# Altium footprint library DIOT_temperature_logger.PcbLib: 100 footprints (part 3 of 7)
Each footprint in its own frame and in the unit in brackets; x right, y up, seen from the top. Pads: shape width x height; smd on the part's side, far side on the other; paste and mask are expansions set on the pad; w line width, h text height; cw(c..) or ccw(c..) is an arc to the next point about the centre after c.
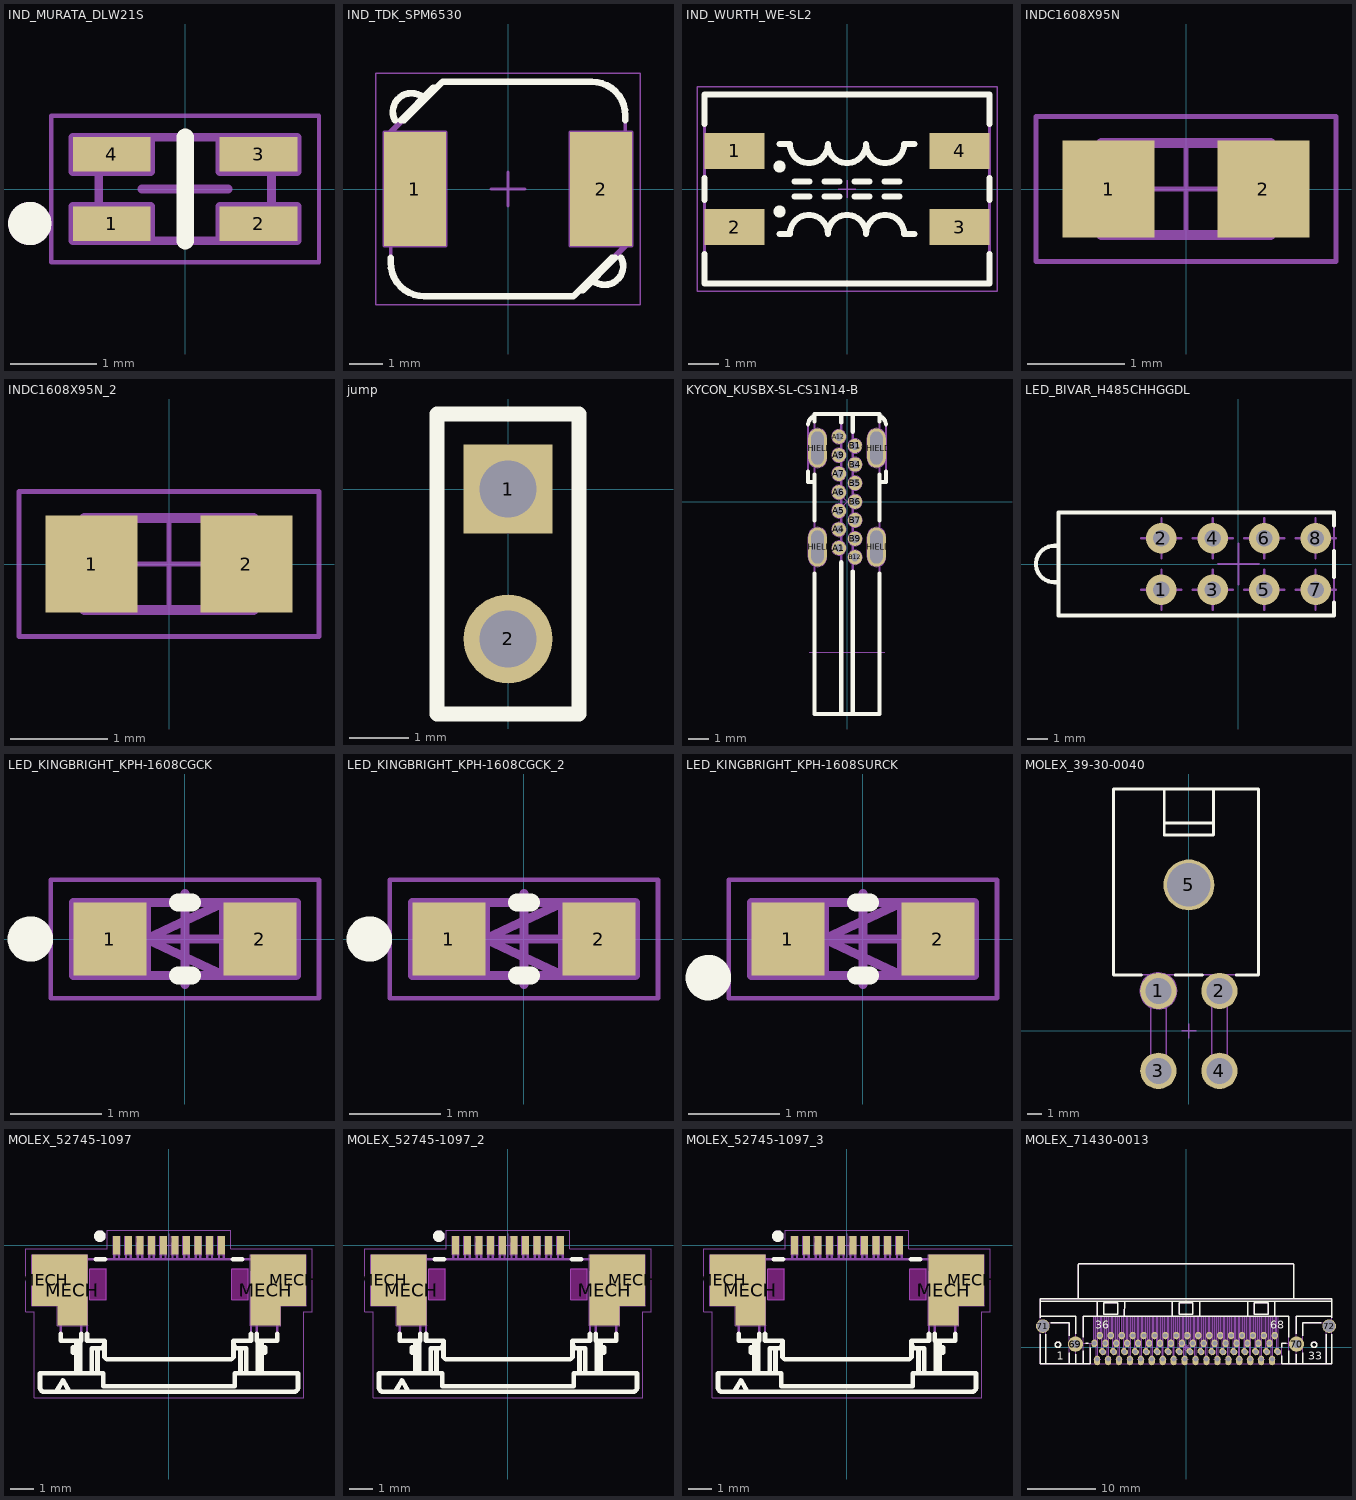
[diagram p2: the footprints below, top view; thin cyan lines are the x and y axes]

## IND_MURATA_DLW21S [mm] "Common Mode Choke Coil, DLW21S Series - Body 2 x 1.2mm"
height 1.4
pads (4):
  rect 0.9x0.4 smd: 1(-0.85,-0.4) 2(0.85,-0.4) 3(0.85,0.4) 4(-0.85,0.4)
Top Overlay:
  circle w0.25: c-1.8,-0.4 r0.125
  lines w0.2: 0,-0.6 0,0.6
Mechanical 8:
  lines w0.1: -0.5,0 0,0 ; 0,-0.5 0,0 ; 0,0.5 0,0 ; 0.5,0 0,0 ; -1.3,-0.6 -1.3,-0.2 ; -1.3,-0.6 -0.4,-0.6 -0.4,-0.2 -1.3,-0.2 ; -1.3,-0.6 -0.85,-0.4 -1.3,-0.2 ; -1.3,0.2 -0.85,0.4 -1.3,0.6 ; -1.3,0.2 -1.3,0.6 ; -1.3,0.2 -0.4,0.2 -0.4,0.6 -1.3,0.6 ; 1.3,-0.6 0.4,-0.6 0.4,-0.2 1.3,-0.2 ; 1.3,-0.6 1.3,-0.2 ; 1.3,-0.6 0.85,-0.4 1.3,-0.2 ; 1.3,-0.6 1.3,-0.2 ; 1.3,0.2 0.4,0.2 0.4,0.6 1.3,0.6 ; 1.3,0.2 0.85,0.4 1.3,0.6 ; 1.3,0.2 1.3,0.6 ; 1.3,0.2 1.3,0.6
Mechanical 14:
  circle w0.25: c-1.8,-0.4 r0.125
  lines w0.1: -1,-0.6 -1,0.6 1,0.6 1,-0.6 -1,-0.6
Mechanical 15:
  lines w0.05: -1.55,-0.85 -1.55,0.85 1.55,0.85 1.55,-0.85 -1.55,-0.85
3D body "IND_MURATA_DLW21S.stp": height 1.4, standoff 0, extent -1,-0.6 1,0.6

## IND_TDK_SPM6530 [mm] "SMD Inductor, 7.1mm L X 6.5mm W X 3mm H, TDK SPM6530 Series"
height 3
pads (2):
  rect 1.85x3.4 smd: 1(-2.775,0) 2(2.775,0)
Top Overlay:
  lines w0.2: -3.5,-2.05 -3.5,-2.2 ccw(c-2.5,-2.2) -2.5,-3.2 1.95,-3.2 3.1,-2.05 ; -3.373,2.05 cw(c-2.883,2.307) -2.532,2.733 -2.524,2.726 ; -3.2,2.05 -2.227,3.023 -2.127,3.023 ; -3.1,2.05 -1.95,3.2 2.5,3.2 cw(c2.5,2.2) 3.5,2.2 3.5,2.05 ; 2.127,-3.023 2.227,-3.023 3.2,-2.05 ; 2.524,-2.726 2.532,-2.733 ccw(c2.883,-2.307) 3.373,-2.05
Mechanical 8:
  lines w0.1: -3.275,0 -2.775,0 ; -2.775,-0.5 -2.775,0 ; -2.775,0.5 -2.775,0 ; -2.275,0 -2.775,0 ; -0.5,0 0,0 ; 0,-0.5 0,0 ; 0,0.5 0,0 ; 0.5,0 0,0 ; 2.275,0 2.775,0 ; 2.775,-0.5 2.775,0 ; 2.775,0.5 2.775,0 ; 3.275,0 2.775,0 ; -3.7,-1.7 -1.85,-1.7 -1.85,1.7 -3.7,1.7 -3.7,-1.7 ; 1.85,-1.7 3.7,-1.7 3.7,1.7 1.85,1.7 1.85,-1.7
Mechanical 14:
  lines w0.1: -3.5,-1.6 -3.6,-1.6 -3.6,1.65 ; -3.302,1.948 -3.309,1.955 cw(c-2.883,2.307) -2.532,2.733 -2.524,2.726 ; -2.127,3.023 -2.227,3.023 -3.6,1.65 ; 2.127,-3.023 2.227,-3.023 3.6,-1.65 ; 2.524,-2.726 2.532,-2.733 ccw(c2.883,-2.307) 3.309,-1.955 3.302,-1.948 ; 3.5,1.6 3.6,1.6 3.6,-1.65 ; -3.6,1.65 -3.5,1.65 ; -3.5,1.65 -3.5,0.9 -2.564,0.9 -2.564,1 cw(c-2.295,1) -2.025,1 -2.025,-1 cw(c-2.295,-1) -2.564,-1 -2.564,-0.9 -3.5,-0.9 -3.5,-2.2 ccw(c-2.5,-2.2) -2.5,-3.2 1.95,-3.2 3.5,-1.65 ; -3.5,1.65 -1.95,3.2 2.5,3.2 cw(c2.5,2.2) 3.5,2.2 3.5,0.9 2.564,0.9 2.564,1 ccw(c2.295,1) 2.025,1 2.025,-1 ccw(c2.295,-1) 2.564,-1 2.564,-0.9 3.5,-0.9 3.5,-1.65 ; 3.5,-1.65 3.6,-1.65
Mechanical 15:
  lines w0.05: -3.95,-3.45 3.95,-3.45 3.95,3.45 -3.95,3.45 -3.95,-3.45
3D body "IND_TDK_SPM6530.stp": height 3.1, standoff 0, extent -3.6,-3.2 3.6,3.2

## IND_WURTH_WE-SL2 [mm] "Common Mode SMD Line Filter WE-SL2"
height 1.45
pads (4):
  rect 2x1.2 smd: 1(-3.75,1.27) 2(-3.75,-1.27) 3(3.75,-1.27) 4(3.75,1.27)
Top Overlay:
  circle w0.2: c-2.25,-0.75 r0.1
  circle w0.2: c-2.25,0.75 r0.1
  lines w0.2: -4.75,-2.175 -4.75,-3.15 4.75,-3.15 4.75,-2.175 ; -4.75,-0.365 -4.75,0.365 ; -4.75,2.175 -4.75,3.15 4.75,3.15 4.75,2.175 ; -2.25,-1.5 -1.905,-1.5 cw(c-1.27,-1.5) -0.635,-1.5 cw(c0,-1.5) 0.635,-1.5 cw(c1.27,-1.5) 1.905,-1.5 2.25,-1.5 ; -2.25,1.5 -1.905,1.5 ccw(c-1.27,1.5) -0.635,1.5 ccw(c0,1.5) 0.635,1.5 ccw(c1.27,1.5) 1.905,1.5 2.25,1.5 ; -1.75,-0.25 -1.25,-0.25 ; -1.75,0.25 -1.25,0.25 ; -0.75,-0.25 -0.25,-0.25 ; -0.75,0.25 -0.25,0.25 ; 0.25,-0.25 0.75,-0.25 ; 0.25,0.25 0.75,0.25 ; 1.25,-0.25 1.75,-0.25 ; 1.25,0.25 1.75,0.25 ; 4.75,-0.365 4.75,0.365
Mechanical 8:
  lines w0.05: -0.3,0 0.3,0 ; 0,-0.3 0,0.3
Mechanical 14:
  circle w0.1: c-2.25,-0.75 r0.1
  circle w0.1: c-2.25,0.75 r0.1
  lines w0.1: -2.25,-1.5 -1.905,-1.5 cw(c-1.27,-1.5) -0.635,-1.5 cw(c0,-1.5) 0.635,-1.5 cw(c1.27,-1.5) 1.905,-1.5 2.25,-1.5 ; -2.25,1.5 -1.905,1.5 ccw(c-1.27,1.5) -0.635,1.5 ccw(c0,1.5) 0.635,1.5 ccw(c1.27,1.5) 1.905,1.5 2.25,1.5 ; -1.75,-0.25 -1.25,-0.25 ; -1.75,0.25 -1.25,0.25 ; -0.75,-0.25 -0.25,-0.25 ; -0.75,0.25 -0.25,0.25 ; 0.25,-0.25 0.75,-0.25 ; 0.25,0.25 0.75,0.25 ; 1.25,-0.25 1.75,-0.25 ; 1.25,0.25 1.75,0.25 ; -4.75,-3.15 -4.75,3.15 4.75,3.15 4.75,-3.15 -4.75,-3.15
Mechanical 15:
  lines w0.05: -5,-3.4 -5,3.4 5,3.4 5,-3.4 -5,-3.4
3D body "IND_WURTH_WE-SL2.stp": height 5.3, standoff 0, extent -4.749,-3.149 4.751,3.151

## INDC1608X95N [mm] "Chip Inductor, 2-Leads, EIA 0603, Metric 1608, Body 1.6x0.8mm, IPC Medium Density"
height 0.95
pads (2):
  rect 0.95x1 smd: 1(-0.8,0) 2(0.8,0)
Mechanical 14:
  lines w0.1: -0.875,-0.475 -0.875,0.475 0.875,0.475 0.875,-0.475 -0.875,-0.475
Mechanical 15:
  lines w0.05: -0.5,0 0.5,0 ; 0,-0.5 0,0.5 ; -1.55,-0.75 -1.55,0.75 1.55,0.75 1.55,-0.75 -1.55,-0.75
3D body "INDC1608X95N.stp": height 0.95, standoff -0.05, extent -0.875,-0.475 0.875,0.475

## INDC1608X95N_2 [mm]
pads (2):
  rect 0.95x1 smd: 1(-0.8,0) 2(0.8,0)
Mechanical 14:
  lines w0.1: -0.875,-0.475 0.875,-0.475 0.875,0.475 -0.875,0.475 -0.875,-0.475
Mechanical 15:
  lines w0.05: -0.5,0 0.5,0 ; 0,-0.5 0,0.5 ; -1.55,-0.75 1.55,-0.75 1.55,0.75 -1.55,0.75 -1.55,-0.75
3D body "INDC1608X95N.stp": height 0.95, standoff -0.05, extent -0.875,-0.475 0.875,0.475

## jump [mm]
height 8.77
pads (2):
  rect 1.5x1.5 hole 0.965: 1(0,0)
  round 1.5 hole 0.965: 2(0,-2.54)
Top Overlay:
  lines w0.254: -1.2,-3.81 1.2,-3.81 1.2,1.27 -1.2,1.27 -1.2,-3.81
3D body "COMATEL_385.0358.1.02.400.stp": height 8, standoff -3.2, extent -1.256,-3.835 1.194,1.245

## KYCON_KUSBX-SL-CS1N14-B [mm] "USB 2.0 Type C Receptacle, High Temp., Flag Style Through Hole 14 Pin, Black"
height 8.34
pads (18):
  round 0.7 hole 0.4: A1(-0.39,-2.25) A4(-0.39,-1.35) A5(-0.39,-0.45) A6(-0.39,0.45) A7(-0.39,1.35) A9(-0.39,2.25) A12(-0.39,3.15) B1(0.39,2.7) B4(0.39,1.8) B5(0.39,0.9) B6(0.39,0) B7(0.39,-0.9) B9(0.39,-1.8) B12(0.39,-2.7)
  oval 0.9x1.9 hole 0.6 slot 1.6 at 90 deg: SHIELD(-1.43,-2.2) SHIELD(-1.43,2.6) SHIELD(1.43,-2.2) SHIELD(1.43,2.6)
Top Overlay:
  lines w0.2: -1.9,1.453 -1.9,0.951 -1.58,0.951 ; -1.891,3.754 cw(c-1.3,3.65) -1.58,4.181 ; -1.58,-3.486 -1.58,-10.3 1.58,-10.3 1.58,-3.486 ; -1.58,-0.914 -1.58,1.314 ; -1.58,3.886 -1.58,4.25 1.58,4.25 1.58,3.886 ; -0.28,-10.3 -0.28,-2.941 ; -0.28,3.841 -0.28,4.25 ; 0.28,-10.3 0.28,-3.391 ; 0.28,3.391 0.28,4.25 ; 1.58,-0.914 1.58,1.314 ; 1.58,0.95 1.9,0.95 1.9,1.453 ; 1.58,4.181 cw(c1.3,3.65) 1.891,3.754
Mechanical 8:
  circle w0.05: c0.39,-2.7 r0.35
  circle w0.05: c0.39,-2.7 r0.2
  circle w0.05: c0.39,-1.8 r0.35
  circle w0.05: c0.39,-0.9 r0.35
  circle w0.05: c0.39,-1.8 r0.2
  circle w0.05: c0.39,0 r0.2
  circle w0.05: c0.39,0 r0.35
  circle w0.05: c0.39,-0.9 r0.2
  circle w0.05: c-0.39,-2.25 r0.35
  circle w0.05: c-0.39,-2.25 r0.2
  circle w0.05: c-0.39,-1.35 r0.35
  circle w0.05: c-0.39,-0.45 r0.2
  circle w0.05: c-0.39,-0.45 r0.35
  circle w0.05: c-0.39,-1.35 r0.2
  circle w0.05: c0.39,0.9 r0.2
  circle w0.05: c0.39,0.9 r0.35
  circle w0.05: c-0.39,0.45 r0.35
  circle w0.05: c0.39,1.8 r0.35
  circle w0.05: c0.39,1.8 r0.2
  circle w0.05: c0.39,2.7 r0.35
  circle w0.05: c0.39,2.7 r0.2
  circle w0.05: c-0.39,3.15 r0.35
  circle w0.05: c-0.39,1.35 r0.2
  circle w0.05: c-0.39,2.25 r0.2
  circle w0.05: c-0.39,0.45 r0.2
  circle w0.05: c-0.39,1.35 r0.35
  circle w0.05: c-0.39,2.25 r0.35
  circle w0.05: c-0.39,3.15 r0.2
  lines w0.05: -1.825,-7.3 1.825,-7.3 ; -1.68,-2.2 -1.43,-2.2 ; -1.68,2.6 -1.43,2.6 ; -1.43,-2.45 -1.43,-2.2 ; -1.43,-1.95 -1.43,-2.2 ; -1.43,2.35 -1.43,2.6 ; -1.43,2.85 -1.43,2.6 ; -1.18,-2.2 -1.43,-2.2 ; -1.18,2.6 -1.43,2.6 ; -0.64,-2.25 -0.39,-2.25 ; -0.64,-1.35 -0.39,-1.35 ; -0.64,-0.45 -0.39,-0.45 ; -0.64,0.45 -0.39,0.45 ; -0.64,1.35 -0.39,1.35 ; -0.64,2.25 -0.39,2.25 ; -0.64,3.15 -0.39,3.15 ; -0.39,-2.5 -0.39,-2.25 ; -0.39,-2 -0.39,-2.25 ; -0.39,-1.6 -0.39,-1.35 ; -0.39,-1.1 -0.39,-1.35 ; -0.39,-0.7 -0.39,-0.45 ; -0.39,-0.2 -0.39,-0.45 ; -0.39,0.2 -0.39,0.45 ; -0.39,0.7 -0.39,0.45 ; -0.39,1.1 -0.39,1.35 ; -0.39,1.6 -0.39,1.35 ; -0.39,2 -0.39,2.25 ; -0.39,2.5 -0.39,2.25 ; -0.39,2.9 -0.39,3.15 ; -0.39,3.4 -0.39,3.15 ; -0.354,-0.354 0,0 ; -0.354,0.354 0,0 ; -0.14,-2.25 -0.39,-2.25 ; -0.14,-1.35 -0.39,-1.35 ; -0.14,-0.45 -0.39,-0.45 ; -0.14,0.45 -0.39,0.45 ; -0.14,1.35 -0.39,1.35 ; -0.14,2.25 -0.39,2.25 ; -0.14,3.15 -0.39,3.15 ; 0.14,-2.7 0.39,-2.7 ; 0.14,-1.8 0.39,-1.8 ; 0.14,-0.9 0.39,-0.9 ; 0.14,0 0.39,0 ; 0.14,0.9 0.39,0.9 ; 0.14,1.8 0.39,1.8 ; 0.14,2.7 0.39,2.7 ; 0.354,-0.354 0,0 ; 0.354,0.354 0,0 ; 0.39,-2.95 0.39,-2.7 ; 0.39,-2.45 0.39,-2.7 ; 0.39,-2.05 0.39,-1.8 ; 0.39,-1.55 0.39,-1.8 ; 0.39,-1.15 0.39,-0.9 ; 0.39,-0.65 0.39,-0.9 ; 0.39,-0.25 0.39,0 ; 0.39,0.25 0.39,0 ; 0.39,0.65 0.39,0.9 ; 0.39,1.15 0.39,0.9 ; 0.39,1.55 0.39,1.8 ; 0.39,2.05 0.39,1.8 ; 0.39,2.45 0.39,2.7 ; 0.39,2.95 0.39,2.7 ; 0.64,-2.7 0.39,-2.7 ; 0.64,-1.8 0.39,-1.8 ; 0.64,-0.9 0.39,-0.9 ; 0.64,0 0.39,0 ; 0.64,0.9 0.39,0.9 ; 0.64,1.8 0.39,1.8 ; 0.64,2.7 0.39,2.7 ; 1.18,-2.2 1.43,-2.2 ; 1.18,2.6 1.43,2.6 ; 1.43,-2.45 1.43,-2.2 ; 1.43,-1.95 1.43,-2.2 ; 1.43,2.35 1.43,2.6 ; 1.43,2.85 1.43,2.6 ; 1.68,-2.2 1.43,-2.2 ; 1.68,2.6 1.43,2.6 ; -1.88,-2.7 ccw(c-1.43,-2.7) -0.98,-2.7 -0.98,-1.7 ccw(c-1.43,-1.7) -1.88,-1.7 -1.88,-2.7 ; -1.88,2.1 ccw(c-1.43,2.1) -0.98,2.1 -0.98,3.1 ccw(c-1.43,3.1) -1.88,3.1 -1.88,2.1 ; -1.73,-2.7 ccw(c-1.43,-2.7) -1.13,-2.7 -1.13,-1.7 ccw(c-1.43,-1.7) -1.73,-1.7 -1.73,-2.7 ; -1.73,2.1 ccw(c-1.43,2.1) -1.13,2.1 -1.13,3.1 ccw(c-1.43,3.1) -1.73,3.1 -1.73,2.1 ; 0.98,-2.7 ccw(c1.43,-2.7) 1.88,-2.7 1.88,-1.7 ccw(c1.43,-1.7) 0.98,-1.7 0.98,-2.7 ; 0.98,2.1 ccw(c1.43,2.1) 1.88,2.1 1.88,3.1 ccw(c1.43,3.1) 0.98,3.1 0.98,2.1 ; 1.13,-2.7 ccw(c1.43,-2.7) 1.73,-2.7 1.73,-1.7 ccw(c1.43,-1.7) 1.13,-1.7 1.13,-2.7 ; 1.13,2.1 ccw(c1.43,2.1) 1.73,2.1 1.73,3.1 ccw(c1.43,3.1) 1.13,3.1 1.13,2.1
Mechanical 14:
  lines w0.1: -1.58,0.951 -1.9,0.951 -1.9,3.65 cw(c-1.3,3.65) -1.58,4.181 ; -0.28,-10.3 -0.28,4.25 ; 0.28,-10.3 0.28,4.25 ; 1.58,0.95 1.9,0.95 1.9,3.65 ccw(c1.3,3.65) 1.58,4.181 ; -1.58,-10.3 1.58,-10.3 1.58,4.25 -1.58,4.25 -1.58,-10.3
3D body "KYCON_KUSBX-SL-CS1N14-B.stp": height 9.04, standoff -2.5, extent -1.9,-10.3 1.9,4.25

## LED_BIVAR_H485CHHGGDL [mm] "Quad-Level 2mm (Green+Green+HeRed+HeRed) LED, PCB Edge Mounting BIVAR H485C Serie"
height 11.3
pads (8):
  round 1.5 hole 0.8: 1(-3.81,-1.27) 2(-3.81,1.27) 3(-1.27,-1.27) 4(-1.27,1.27) 5(1.27,-1.27) 6(1.27,1.27) 7(3.81,-1.27) 8(3.81,1.27)
Top Overlay:
  lines w0.2: -8.89,-0.9 -9.09,-0.9 cw(c-9.09,0) -9.09,0.9 -8.89,0.9 ; 4.71,-1.902 4.71,-2.55 -8.89,-2.55 -8.89,2.55 4.71,2.55 4.71,1.902 ; 4.71,-0.638 4.71,0.638
Mechanical 8:
  lines w0.1: -4.81,-1.27 -3.81,-1.27 ; -4.81,1.27 -3.81,1.27 ; -3.81,-2.27 -3.81,-1.27 ; -3.81,-0.27 -3.81,-1.27 ; -3.81,0.27 -3.81,1.27 ; -3.81,2.27 -3.81,1.27 ; -2.81,-1.27 -3.81,-1.27 ; -2.81,1.27 -3.81,1.27 ; -2.27,-1.27 -1.27,-1.27 ; -2.27,1.27 -1.27,1.27 ; -1.27,-2.27 -1.27,-1.27 ; -1.27,-0.27 -1.27,-1.27 ; -1.27,0.27 -1.27,1.27 ; -1.27,2.27 -1.27,1.27 ; -1,0 0,0 ; -0.27,-1.27 -1.27,-1.27 ; -0.27,1.27 -1.27,1.27 ; 0,-1 0,0 ; 0,1 0,0 ; 0.27,-1.27 1.27,-1.27 ; 0.27,1.27 1.27,1.27 ; 1,0 0,0 ; 1.27,-2.27 1.27,-1.27 ; 1.27,-0.27 1.27,-1.27 ; 1.27,0.27 1.27,1.27 ; 1.27,2.27 1.27,1.27 ; 2.27,-1.27 1.27,-1.27 ; 2.27,1.27 1.27,1.27 ; 2.81,-1.27 3.81,-1.27 ; 2.81,1.27 3.81,1.27 ; 3.81,-2.27 3.81,-1.27 ; 3.81,-0.27 3.81,-1.27 ; 3.81,0.27 3.81,1.27 ; 3.81,2.27 3.81,1.27 ; 4.81,-1.27 3.81,-1.27 ; 4.81,1.27 3.81,1.27
Mechanical 14:
  lines w0.1: -8.89,-0.9 -9.09,-0.9 cw(c-9.09,0) -9.09,0.9 -8.89,0.9 ; -8.89,-2.55 4.71,-2.55 4.71,2.55 -8.89,2.55 -8.89,-2.55
  text "A" at 5.08,0.889 h1
  text "C" at 5.08,-1.651 h1
  text "D" at 3.029,-0.331 h1
  text "C" at 0.489,-0.331 h1
  text "B" at -2.051,-0.331 h1
  text "A" at -4.591,-0.331 h1
3D body "LED_BIVAR_H485CHHGGDL.stp": height 11.3, standoff -3.2, extent -9.99,-2.55 4.71,2.55

## LED_KINGBRIGHT_KPH-1608CGCK [mm] "SMT Green LED, Case 0603, Body L 1.6 x W 0.8mm H 0.65mm"
height 0.65
pads (2):
  rect 0.8x0.8 smd: 1(-0.825,0) 2(0.825,0)
Top Overlay:
  circle w0.25: c-1.7,0 r0.125
  lines w0.2: -0.075,-0.4 0.075,-0.4 ; -0.075,0.4 0.075,0.4
Mechanical 8:
  lines w0.1: -0.5,0 0,0 ; -0.425,0 0.425,0 ; 0,-0.5 0,0 ; 0,0.5 0,0 ; 0.5,0 0,0 ; -0.425,-0.4 -1.225,-0.4 -1.225,0.4 -0.425,0.4 ; -0.425,-0.4 -0.425,0.4 ; -0.425,-0.4 -0.825,0 -0.425,0.4 ; 1.225,-0.4 0.425,-0.4 0.425,0.4 1.225,0.4 ; 1.225,-0.4 1.225,0.4 ; 1.225,-0.4 0.825,0 1.225,0.4
Mechanical 14:
  lines w0.1: -0.8,-0.4 -0.8,0.4 0.8,0.4 0.8,-0.4 -0.8,-0.4 ; -0.425,0 0.425,0.4 0.425,-0.4 -0.425,0
Mechanical 15:
  lines w0.05: -1.475,-0.65 -1.475,0.65 1.475,0.65 1.475,-0.65 -1.475,-0.65
3D body "LED_KINGBRIGHT_KPH-1608CGCK_Part1.stp": height 0.2, standoff 0, extent -0.8,-0.4 0.8,0.4
3D body "LED_KINGBRIGHT_KPH-1608CGCK_Part2.stp": height 0.65, standoff 0.12, extent -0.6,-0.4 0.6,0.4

## LED_KINGBRIGHT_KPH-1608CGCK_2 [mm]
pads (2):
  rect 0.8x0.8 smd: 1(-0.825,0) 2(0.825,0)
Top Overlay:
  circle w0.25: c-1.7,0 r0.125
  lines w0.2: -0.075,-0.4 0.075,-0.4 ; -0.075,0.4 0.075,0.4
Mechanical 8:
  lines w0.1: -0.5,0 0,0 ; -0.425,0 0.425,0 ; 0,-0.5 0,0 ; 0,0.5 0,0 ; 0.5,0 0,0 ; -0.425,-0.4 -0.425,0.4 ; -0.425,-0.4 -0.825,0 -0.425,0.4 ; -0.425,-0.4 -1.225,-0.4 -1.225,0.4 -0.425,0.4 ; 1.225,-0.4 1.225,0.4 ; 1.225,-0.4 0.825,0 1.225,0.4 ; 1.225,-0.4 0.425,-0.4 0.425,0.4 1.225,0.4
Mechanical 14:
  lines w0.1: -0.8,-0.4 0.8,-0.4 0.8,0.4 -0.8,0.4 -0.8,-0.4 ; -0.425,0 0.425,0.4 0.425,-0.4 -0.425,0
Mechanical 15:
  lines w0.05: -1.475,-0.65 1.475,-0.65 1.475,0.65 -1.475,0.65 -1.475,-0.65
3D body "LED_KINGBRIGHT_KPH-1608CGCK_Part2.stp": height 0.65, standoff 0.12, extent -0.6,-0.4 0.6,0.4
3D body "LED_KINGBRIGHT_KPH-1608CGCK_Part1.stp": height 0.2, standoff 0, extent -0.8,-0.4 0.8,0.4

## LED_KINGBRIGHT_KPH-1608SURCK [mm] "SMT Hyper Red LED, Case 0603, Body L 1.6 x W 0.8mm H 0.65mm"
height 0.65
pads (2):
  rect 0.8x0.8 smd: 1(-0.825,0) 2(0.825,0)
Top Overlay:
  circle w0.25: c-1.7,-0.425 r0.125
  lines w0.2: -0.075,-0.4 0.075,-0.4 ; -0.075,0.4 0.075,0.4
Mechanical 8:
  lines w0.1: -0.5,0 0,0 ; -0.425,0 0.425,0 ; 0,-0.5 0,0 ; 0,0.5 0,0 ; 0.5,0 0,0 ; -0.425,-0.4 -0.825,0 -0.425,0.4 ; -0.425,-0.4 -0.425,0.4 ; -0.425,-0.4 -1.225,-0.4 -1.225,0.4 -0.425,0.4 ; 1.225,-0.4 0.825,0 1.225,0.4 ; 1.225,-0.4 1.225,0.4 ; 1.225,-0.4 0.425,-0.4 0.425,0.4 1.225,0.4
Mechanical 14:
  lines w0.1: -0.8,-0.4 0.8,-0.4 0.8,0.4 -0.8,0.4 -0.8,-0.4 ; -0.425,0 0.425,-0.4 0.425,0.4 -0.425,0
Mechanical 15:
  lines w0.05: -1.475,-0.65 1.475,-0.65 1.475,0.65 -1.475,0.65 -1.475,-0.65
3D body "LED_KINGBRIGHT_KPH-1608SURCK_Part1.stp": height 0.2, standoff 0, extent -0.8,-0.4 0.8,0.4
3D body "LED_KINGBRIGHT_KPH-1608SURCK_Part2.stp": height 0.65, standoff 0.12, extent -0.6,-0.4 0.6,0.4

## MOLEX_39-30-0040 [mm] "4.20mm (.165\") Pitch Mini-Fit Jr. Header, Dual Row, Right Angle with Snap-in Plastic Peg PCB Lock, 4 Circuits"
height 11.4
pads (5):
  round 2.5 hole 1.8: 1(-2.1,2.75) 2(2.1,2.75) 3(-2.1,-2.75) 4(2.1,-2.75)
  round 3.5 hole 3 unplated mask+1: 5(0,10.05)
Top Overlay:
  lines w0.2: -3.262,3.85 -5.2,3.85 -5.2,16.65 4.8,16.65 4.8,3.85 3.262,3.85 ; -1.7,14.3 1.7,14.3 ; -1.7,16.65 -1.7,13.478 1.7,13.478 1.7,16.65 ; -0.938,3.85 0.938,3.85
Mechanical 8:
  circle w0.1: c0,10.05 r1.5
  circle w0.1: c-2.1,2.75 r0.9
  circle w0.1: c-2.1,2.75 r1.25
  lines w0.1: -2.6,-2.75 -2.1,-2.75 ; -2.6,2.75 -2.1,2.75 ; -2.1,-3.25 -2.1,-2.75 ; -2.1,-2.25 -2.1,-2.75 ; -2.1,2.25 -2.1,2.75 ; -2.1,3.25 -2.1,2.75 ; -1.6,-2.75 -2.1,-2.75 ; -1.6,2.75 -2.1,2.75 ; -0.5,0 0,0 ; -0.5,10.05 0,10.05 ; 0,-0.5 0,0 ; 0,0.5 0,0 ; 0,9.55 0,10.05 ; 0,10.55 0,10.05 ; 0.5,0 0,0 ; 0.5,10.05 0,10.05 ; 1.6,-2.75 2.1,-2.75 ; 1.6,2.75 2.1,2.75 ; 2.1,-3.25 2.1,-2.75 ; 2.1,-2.25 2.1,-2.75 ; 2.1,2.25 2.1,2.75 ; 2.1,3.25 2.1,2.75 ; 2.6,-2.75 2.1,-2.75 ; 2.6,2.75 2.1,2.75
Mechanical 14:
  lines w0.1: -2.635,3.85 -2.635,-3.285 -1.565,-3.285 -1.565,3.85 ; -1.7,14.3 1.7,14.3 ; -1.7,16.65 -1.7,13.478 1.7,13.478 1.7,16.65 ; 1.565,3.85 1.565,-3.285 2.635,-3.285 2.635,3.85 ; -5.2,3.85 4.8,3.85 4.8,16.65 -5.2,16.65 -5.2,3.85
  text "1" at -4.475,1.8 h1.2
3D body "MOLEX_39-30-0040.stp": height 11.4, standoff -3.6, extent -5.2,-3.285 4.8,16.65

## MOLEX_52745-1097 [mm] "10 Contacts, 0.5mm Pitch, Right Angled Surface Mount FPC Connector, ZIF, Top Contact Style"
height 2
pads (14):
  rect 0.3x0.8 smd: 1(-2.25,0) 2(-1.75,0) 3(-1.25,0) 4(-0.75,0) 5(-0.24,0) 6(0.25,0) 7(0.75,0) 8(1.25,0) 9(1.75,0) 10(2.25,0)
  rect 1.1x2.2 smd: MECH(-5.35,-1.5) MECH(5.35,-1.5)
  rect 1.3x3.05 smd: MECH(-4.15,-1.925) MECH(4.15,-1.925)
Top Layer keep-out:
  region: 2.7,-1 3.4,-1 3.4,-2.34 2.7,-2.34
  region: -3.4,-1 -2.7,-1 -2.7,-2.34 -3.4,-2.34
Top Overlay:
  circle w0.25: c-2.975,0.4 r0.125
  lines w0.2: -4.85,-6.3 -4.564,-5.8 -4.275,-6.3 ; -4.65,-3.8 -4.65,-4.1 -3.775,-4.1 -3.775,-3.8 ; -3.975,-5.5 -3.975,-4.1 ; -3.975,-4.7 -4.125,-4.613 -4.125,-4.387 -3.975,-4.3 ; -3.815,-5.5 -3.815,-4.1 ; -3.525,-3.8 -3.525,-4.1 -2.775,-4.1 -2.775,-4.8 -2.675,-4.9 2.675,-4.9 2.775,-4.8 2.775,-4.1 3.525,-4.1 3.525,-3.8 ; -3.325,-5.5 -3.325,-4.426 -3.075,-4.426 ; -3.15,-0.6 -2.75,-0.6 ; -3.075,-5.5 -3.075,-4.426 ; -2.775,-4.216 cw(c-2.985,-4.216) -2.985,-4.426 -3.075,-4.426 ; 2.75,-0.6 3.15,-0.6 ; 2.775,-4.216 ccw(c2.985,-4.216) 2.985,-4.426 3.325,-4.426 3.325,-5.5 ; 3.075,-5.5 3.075,-4.426 ; 3.775,-3.8 3.775,-4.1 4.65,-4.1 4.65,-3.8 ; 3.815,-5.5 3.815,-4.1 ; 3.975,-5.5 3.975,-4.1 ; 3.975,-4.7 4.125,-4.613 4.125,-4.387 3.975,-4.3 ; -5.55,-6.1 ccw(c-5.35,-6.1) -5.35,-6.3 5.35,-6.3 ccw(c5.35,-6.1) 5.55,-6.1 5.55,-5.5 2.825,-5.5 2.825,-6.05 -2.825,-6.05 -2.825,-5.5 -5.55,-5.5 -5.55,-6.1
Mechanical 8:
  lines w0.05: -4.8,-0.4 -4.15,-1.925 -3.5,-0.4 ; -0.5,0 0,0 ; 0,-0.5 0,0 ; 0,0.5 0,0 ; 0.5,0 0,0 ; 4.8,-0.4 4.15,-1.925 3.5,-0.4 ; -5.9,-2.6 -5.35,-1.5 -4.8,-2.6 ; -5.9,-2.6 -5.9,-0.4 ; -5.9,-2.6 -4.8,-2.6 ; -5.9,-0.4 -4.7,-1.925 -3.5,-3.45 ; -5.9,-0.4 -3.5,-0.4 ; -4.8,-2.6 -4.8,-3.45 -3.5,-3.45 ; -3.5,-3.45 -3.5,-0.4 ; -2.4,0.4 -2.1,0.4 ; -2.4,0.4 -2.4,-0.4 -2.1,-0.4 -2.1,0.4 ; -2.4,0.4 -2.25,0 -2.1,0.4 ; -1.9,0.4 -1.6,0.4 ; -1.9,0.4 -1.9,-0.4 -1.6,-0.4 -1.6,0.4 ; -1.9,0.4 -1.75,0 -1.6,0.4 ; -1.4,0.4 -1.1,0.4 ; -1.4,0.4 -1.4,-0.4 -1.1,-0.4 -1.1,0.4 ; -1.4,0.4 -1.25,0 -1.1,0.4 ; -0.9,0.4 -0.6,0.4 ; -0.9,0.4 -0.9,-0.4 -0.6,-0.4 -0.6,0.4 ; -0.9,0.4 -0.75,0 -0.6,0.4 ; -0.4,0.4 -0.1,0.4 ; -0.4,0.4 -0.4,-0.4 -0.1,-0.4 -0.1,0.4 ; -0.4,0.4 -0.25,0 -0.1,0.4 ; 0.1,0.4 0.4,0.4 ; 0.1,0.4 0.1,-0.4 0.4,-0.4 0.4,0.4 ; 0.1,0.4 0.25,0 0.4,0.4 ; 0.6,0.4 0.9,0.4 ; 0.6,0.4 0.6,-0.4 0.9,-0.4 0.9,0.4 ; 0.6,0.4 0.75,0 0.9,0.4 ; 1.1,0.4 1.4,0.4 ; 1.1,0.4 1.1,-0.4 1.4,-0.4 1.4,0.4 ; 1.1,0.4 1.25,0 1.4,0.4 ; 1.6,0.4 1.9,0.4 ; 1.6,0.4 1.6,-0.4 1.9,-0.4 1.9,0.4 ; 1.6,0.4 1.75,0 1.9,0.4 ; 2.1,0.4 2.4,0.4 ; 2.1,0.4 2.1,-0.4 2.4,-0.4 2.4,0.4 ; 2.1,0.4 2.25,0 2.4,0.4 ; 3.5,-3.45 4.7,-1.925 5.9,-0.4 ; 3.5,-3.45 4.8,-3.45 4.8,-2.6 ; 3.5,-3.45 3.5,-0.4 ; 3.5,-0.4 5.9,-0.4 ; 4.8,-2.6 5.35,-1.5 5.9,-2.6 ; 4.8,-2.6 5.9,-2.6 ; 5.9,-2.6 5.9,-0.4 ; -3.4,-2.34 -2.7,-2.34 -2.7,-1 -3.4,-1 -3.4,-2.34 ; 2.7,-2.34 3.4,-2.34 3.4,-1 2.7,-1 2.7,-2.34
Mechanical 14:
  circle w0.25: c-2.975,0.4 r0.125
  lines w0.1: -4.85,-6.3 -4.564,-5.8 -4.275,-6.3 ; -4.65,-1.8 -5.35,-1.8 -5.35,-1.6 -4.85,-1.6 -4.85,-1.3 -5.35,-1.3 -5.35,-1.1 -4.85,-1.1 -4.85,-0.9 -4.65,-0.9 ; -3.975,-5.5 -3.975,-4.1 ; -3.975,-4.7 -4.125,-4.613 -4.125,-4.387 -3.975,-4.3 ; -3.815,-5.5 -3.815,-4.1 ; -3.325,-5.5 -3.325,-4.426 -3.075,-4.426 ; -3.075,-5.5 -3.075,-4.426 ; -2.775,-4.216 cw(c-2.985,-4.216) -2.985,-4.426 -3.075,-4.426 ; -2.35,-0.593 -2.35,0.1 -2.15,0.1 -2.15,-0.593 ; -1.85,-0.593 -1.85,0.1 -1.65,0.1 -1.65,-0.593 ; -1.35,-0.593 -1.35,0.1 -1.15,0.1 -1.15,-0.593 ; -0.85,-0.593 -0.85,0.1 -0.65,0.1 -0.65,-0.593 ; -0.35,-0.593 -0.35,0.1 -0.15,0.1 -0.15,-0.593 ; 0.15,-0.593 0.15,0.1 0.35,0.1 0.35,-0.593 ; 0.65,-0.593 0.65,0.1 0.85,0.1 0.85,-0.593 ; 1.15,-0.593 1.15,0.1 1.35,0.1 1.35,-0.593 ; 1.65,-0.593 1.65,0.1 1.85,0.1 1.85,-0.593 ; 2.15,-0.593 2.15,0.1 2.35,0.1 2.35,-0.593 ; 2.775,-4.216 ccw(c2.985,-4.216) 2.985,-4.426 3.325,-4.426 3.325,-5.5 ; 3.075,-5.5 3.075,-4.426 ; 3.815,-5.5 3.815,-4.1 ; 3.975,-5.5 3.975,-4.1 ; 3.975,-4.7 4.125,-4.613 4.125,-4.387 3.975,-4.3 ; 4.65,-1.8 5.35,-1.8 5.35,-1.6 4.85,-1.6 4.85,-1.3 5.35,-1.3 5.35,-1.1 4.85,-1.1 4.85,-0.9 4.65,-0.9 ; -5.55,-6.1 ccw(c-5.35,-6.1) -5.35,-6.3 5.35,-6.3 ccw(c5.35,-6.1) 5.55,-6.1 5.55,-5.5 2.825,-5.5 2.825,-6.05 -2.825,-6.05 -2.825,-5.5 -5.55,-5.5 -5.55,-6.1 ; -4.65,-4.1 -4.65,-0.6 4.65,-0.6 4.65,-4.1 3.775,-4.1 3.775,-1.225 ccw(c3.65,-1.225) 3.525,-1.225 3.525,-4.1 2.775,-4.1 2.775,-4.8 2.675,-4.9 -2.675,-4.9 -2.775,-4.8 -2.775,-4.1 -3.525,-4.1 -3.525,-1.225 ccw(c-3.65,-1.225) -3.775,-1.225 -3.775,-4.1 -4.65,-4.1
Mechanical 15:
  lines w0.05: -6.15,-2.85 -6.15,-0.15 -2.65,-0.15 -2.65,0.65 2.65,0.65 2.65,-0.15 6.15,-0.15 6.15,-2.85 5.8,-2.85 5.8,-6.55 -5.8,-6.55 -5.8,-2.85 -6.15,-2.85
3D body "MOLEX_52745-1097.stp": height 2, standoff 0, extent -5.55,-6.3 5.55,0.1

## MOLEX_52745-1097_2 [mm]
pads (14):
  rect 0.3x0.8 smd: 1(-2.25,0) 2(-1.75,0) 3(-1.25,0) 4(-0.75,0) 5(-0.24,0) 6(0.25,0) 7(0.75,0) 8(1.25,0) 9(1.75,0) 10(2.25,0)
  rect 1.1x2.2 smd: MECH(-5.35,-1.5) MECH(5.35,-1.5)
  rect 1.3x3.05 smd: MECH(-4.15,-1.925) MECH(4.15,-1.925)
Top Layer keep-out:
  region: 2.7,-1 3.4,-1 3.4,-2.34 2.7,-2.34
  region: -3.4,-1 -2.7,-1 -2.7,-2.34 -3.4,-2.34
Top Overlay:
  circle w0.25: c-2.975,0.4 r0.125
  lines w0.2: -4.85,-6.3 -4.564,-5.8 -4.275,-6.3 ; -4.65,-3.8 -4.65,-4.1 -3.775,-4.1 -3.775,-3.8 ; -3.975,-5.5 -3.975,-4.1 ; -3.975,-4.7 -4.125,-4.613 -4.125,-4.387 -3.975,-4.3 ; -3.815,-5.5 -3.815,-4.1 ; -3.525,-3.8 -3.525,-4.1 -2.775,-4.1 -2.775,-4.8 -2.675,-4.9 2.675,-4.9 2.775,-4.8 2.775,-4.1 3.525,-4.1 3.525,-3.8 ; -3.325,-5.5 -3.325,-4.426 -3.075,-4.426 ; -3.15,-0.6 -2.75,-0.6 ; -3.075,-5.5 -3.075,-4.426 ; -2.775,-4.216 cw(c-2.985,-4.216) -2.985,-4.426 -3.075,-4.426 ; 2.75,-0.6 3.15,-0.6 ; 2.775,-4.216 ccw(c2.985,-4.216) 2.985,-4.426 3.325,-4.426 3.325,-5.5 ; 3.075,-5.5 3.075,-4.426 ; 3.775,-3.8 3.775,-4.1 4.65,-4.1 4.65,-3.8 ; 3.815,-5.5 3.815,-4.1 ; 3.975,-5.5 3.975,-4.1 ; 3.975,-4.7 4.125,-4.613 4.125,-4.387 3.975,-4.3 ; -5.55,-6.1 ccw(c-5.35,-6.1) -5.35,-6.3 5.35,-6.3 ccw(c5.35,-6.1) 5.55,-6.1 5.55,-5.5 2.825,-5.5 2.825,-6.05 -2.825,-6.05 -2.825,-5.5 -5.55,-5.5 -5.55,-6.1
Mechanical 8:
  lines w0.05: -4.8,-0.4 -4.15,-1.925 -3.5,-0.4 ; -0.5,0 0,0 ; 0,-0.5 0,0 ; 0,0.5 0,0 ; 0.5,0 0,0 ; 4.8,-0.4 4.15,-1.925 3.5,-0.4 ; -5.9,-2.6 -5.35,-1.5 -4.8,-2.6 ; -5.9,-2.6 -5.9,-0.4 ; -5.9,-2.6 -4.8,-2.6 ; -5.9,-0.4 -4.7,-1.925 -3.5,-3.45 ; -5.9,-0.4 -3.5,-0.4 ; -4.8,-2.6 -4.8,-3.45 -3.5,-3.45 ; -3.5,-3.45 -3.5,-0.4 ; -2.4,0.4 -2.1,0.4 ; -2.4,0.4 -2.4,-0.4 -2.1,-0.4 -2.1,0.4 ; -2.4,0.4 -2.25,0 -2.1,0.4 ; -1.9,0.4 -1.6,0.4 ; -1.9,0.4 -1.9,-0.4 -1.6,-0.4 -1.6,0.4 ; -1.9,0.4 -1.75,0 -1.6,0.4 ; -1.4,0.4 -1.1,0.4 ; -1.4,0.4 -1.4,-0.4 -1.1,-0.4 -1.1,0.4 ; -1.4,0.4 -1.25,0 -1.1,0.4 ; -0.9,0.4 -0.6,0.4 ; -0.9,0.4 -0.9,-0.4 -0.6,-0.4 -0.6,0.4 ; -0.9,0.4 -0.75,0 -0.6,0.4 ; -0.4,0.4 -0.1,0.4 ; -0.4,0.4 -0.4,-0.4 -0.1,-0.4 -0.1,0.4 ; -0.4,0.4 -0.25,0 -0.1,0.4 ; 0.1,0.4 0.4,0.4 ; 0.1,0.4 0.1,-0.4 0.4,-0.4 0.4,0.4 ; 0.1,0.4 0.25,0 0.4,0.4 ; 0.6,0.4 0.9,0.4 ; 0.6,0.4 0.6,-0.4 0.9,-0.4 0.9,0.4 ; 0.6,0.4 0.75,0 0.9,0.4 ; 1.1,0.4 1.4,0.4 ; 1.1,0.4 1.1,-0.4 1.4,-0.4 1.4,0.4 ; 1.1,0.4 1.25,0 1.4,0.4 ; 1.6,0.4 1.9,0.4 ; 1.6,0.4 1.6,-0.4 1.9,-0.4 1.9,0.4 ; 1.6,0.4 1.75,0 1.9,0.4 ; 2.1,0.4 2.4,0.4 ; 2.1,0.4 2.1,-0.4 2.4,-0.4 2.4,0.4 ; 2.1,0.4 2.25,0 2.4,0.4 ; 3.5,-3.45 4.7,-1.925 5.9,-0.4 ; 3.5,-3.45 4.8,-3.45 4.8,-2.6 ; 3.5,-3.45 3.5,-0.4 ; 3.5,-0.4 5.9,-0.4 ; 4.8,-2.6 5.35,-1.5 5.9,-2.6 ; 4.8,-2.6 5.9,-2.6 ; 5.9,-2.6 5.9,-0.4 ; -3.4,-2.34 -2.7,-2.34 -2.7,-1 -3.4,-1 -3.4,-2.34 ; 2.7,-2.34 3.4,-2.34 3.4,-1 2.7,-1 2.7,-2.34
Mechanical 14:
  circle w0.25: c-2.975,0.4 r0.125
  lines w0.1: -4.85,-6.3 -4.564,-5.8 -4.275,-6.3 ; -4.65,-1.8 -5.35,-1.8 -5.35,-1.6 -4.85,-1.6 -4.85,-1.3 -5.35,-1.3 -5.35,-1.1 -4.85,-1.1 -4.85,-0.9 -4.65,-0.9 ; -3.975,-5.5 -3.975,-4.1 ; -3.975,-4.7 -4.125,-4.613 -4.125,-4.387 -3.975,-4.3 ; -3.815,-5.5 -3.815,-4.1 ; -3.325,-5.5 -3.325,-4.426 -3.075,-4.426 ; -3.075,-5.5 -3.075,-4.426 ; -2.775,-4.216 cw(c-2.985,-4.216) -2.985,-4.426 -3.075,-4.426 ; -2.35,-0.593 -2.35,0.1 -2.15,0.1 -2.15,-0.593 ; -1.85,-0.593 -1.85,0.1 -1.65,0.1 -1.65,-0.593 ; -1.35,-0.593 -1.35,0.1 -1.15,0.1 -1.15,-0.593 ; -0.85,-0.593 -0.85,0.1 -0.65,0.1 -0.65,-0.593 ; -0.35,-0.593 -0.35,0.1 -0.15,0.1 -0.15,-0.593 ; 0.15,-0.593 0.15,0.1 0.35,0.1 0.35,-0.593 ; 0.65,-0.593 0.65,0.1 0.85,0.1 0.85,-0.593 ; 1.15,-0.593 1.15,0.1 1.35,0.1 1.35,-0.593 ; 1.65,-0.593 1.65,0.1 1.85,0.1 1.85,-0.593 ; 2.15,-0.593 2.15,0.1 2.35,0.1 2.35,-0.593 ; 2.775,-4.216 ccw(c2.985,-4.216) 2.985,-4.426 3.325,-4.426 3.325,-5.5 ; 3.075,-5.5 3.075,-4.426 ; 3.815,-5.5 3.815,-4.1 ; 3.975,-5.5 3.975,-4.1 ; 3.975,-4.7 4.125,-4.613 4.125,-4.387 3.975,-4.3 ; 4.65,-1.8 5.35,-1.8 5.35,-1.6 4.85,-1.6 4.85,-1.3 5.35,-1.3 5.35,-1.1 4.85,-1.1 4.85,-0.9 4.65,-0.9 ; -5.55,-6.1 ccw(c-5.35,-6.1) -5.35,-6.3 5.35,-6.3 ccw(c5.35,-6.1) 5.55,-6.1 5.55,-5.5 2.825,-5.5 2.825,-6.05 -2.825,-6.05 -2.825,-5.5 -5.55,-5.5 -5.55,-6.1 ; -4.65,-4.1 -4.65,-0.6 4.65,-0.6 4.65,-4.1 3.775,-4.1 3.775,-1.225 ccw(c3.65,-1.225) 3.525,-1.225 3.525,-4.1 2.775,-4.1 2.775,-4.8 2.675,-4.9 -2.675,-4.9 -2.775,-4.8 -2.775,-4.1 -3.525,-4.1 -3.525,-1.225 ccw(c-3.65,-1.225) -3.775,-1.225 -3.775,-4.1 -4.65,-4.1
Mechanical 15:
  lines w0.05: -6.15,-2.85 -6.15,-0.15 -2.65,-0.15 -2.65,0.65 2.65,0.65 2.65,-0.15 6.15,-0.15 6.15,-2.85 5.8,-2.85 5.8,-6.55 -5.8,-6.55 -5.8,-2.85 -6.15,-2.85
3D body "MOLEX_52745-1097.stp": height 2, standoff 0, extent -5.55,-6.3 5.55,0.1

## MOLEX_52745-1097_3 [mm]
pads (14):
  rect 0.3x0.8 smd: 1(-2.25,0) 2(-1.75,0) 3(-1.25,0) 4(-0.75,0) 5(-0.24,0) 6(0.25,0) 7(0.75,0) 8(1.25,0) 9(1.75,0) 10(2.25,0)
  rect 1.1x2.2 smd: MECH(-5.35,-1.5) MECH(5.35,-1.5)
  rect 1.3x3.05 smd: MECH(-4.15,-1.925) MECH(4.15,-1.925)
Top Layer keep-out:
  region: 2.7,-1 3.4,-1 3.4,-2.34 2.7,-2.34
  region: -3.4,-1 -2.7,-1 -2.7,-2.34 -3.4,-2.34
Top Overlay:
  circle w0.25: c-2.975,0.4 r0.125
  lines w0.2: -4.85,-6.3 -4.564,-5.8 -4.275,-6.3 ; -4.65,-3.8 -4.65,-4.1 -3.775,-4.1 -3.775,-3.8 ; -3.975,-5.5 -3.975,-4.1 ; -3.975,-4.7 -4.125,-4.613 -4.125,-4.387 -3.975,-4.3 ; -3.815,-5.5 -3.815,-4.1 ; -3.525,-3.8 -3.525,-4.1 -2.775,-4.1 -2.775,-4.8 -2.675,-4.9 2.675,-4.9 2.775,-4.8 2.775,-4.1 3.525,-4.1 3.525,-3.8 ; -3.325,-5.5 -3.325,-4.426 -3.075,-4.426 ; -3.15,-0.6 -2.75,-0.6 ; -3.075,-5.5 -3.075,-4.426 ; -2.775,-4.216 cw(c-2.985,-4.216) -2.985,-4.426 -3.075,-4.426 ; 2.75,-0.6 3.15,-0.6 ; 2.775,-4.216 ccw(c2.985,-4.216) 2.985,-4.426 3.325,-4.426 3.325,-5.5 ; 3.075,-5.5 3.075,-4.426 ; 3.775,-3.8 3.775,-4.1 4.65,-4.1 4.65,-3.8 ; 3.815,-5.5 3.815,-4.1 ; 3.975,-5.5 3.975,-4.1 ; 3.975,-4.7 4.125,-4.613 4.125,-4.387 3.975,-4.3 ; -5.55,-6.1 ccw(c-5.35,-6.1) -5.35,-6.3 5.35,-6.3 ccw(c5.35,-6.1) 5.55,-6.1 5.55,-5.5 2.825,-5.5 2.825,-6.05 -2.825,-6.05 -2.825,-5.5 -5.55,-5.5 -5.55,-6.1
Mechanical 8:
  lines w0.05: -4.8,-0.4 -4.15,-1.925 -3.5,-0.4 ; -0.5,0 0,0 ; 0,-0.5 0,0 ; 0,0.5 0,0 ; 0.5,0 0,0 ; 4.8,-0.4 4.15,-1.925 3.5,-0.4 ; -5.9,-2.6 -5.35,-1.5 -4.8,-2.6 ; -5.9,-2.6 -5.9,-0.4 ; -5.9,-2.6 -4.8,-2.6 ; -5.9,-0.4 -4.7,-1.925 -3.5,-3.45 ; -5.9,-0.4 -3.5,-0.4 ; -4.8,-2.6 -4.8,-3.45 -3.5,-3.45 ; -3.5,-3.45 -3.5,-0.4 ; -2.4,0.4 -2.1,0.4 ; -2.4,0.4 -2.4,-0.4 -2.1,-0.4 -2.1,0.4 ; -2.4,0.4 -2.25,0 -2.1,0.4 ; -1.9,0.4 -1.6,0.4 ; -1.9,0.4 -1.9,-0.4 -1.6,-0.4 -1.6,0.4 ; -1.9,0.4 -1.75,0 -1.6,0.4 ; -1.4,0.4 -1.1,0.4 ; -1.4,0.4 -1.4,-0.4 -1.1,-0.4 -1.1,0.4 ; -1.4,0.4 -1.25,0 -1.1,0.4 ; -0.9,0.4 -0.6,0.4 ; -0.9,0.4 -0.9,-0.4 -0.6,-0.4 -0.6,0.4 ; -0.9,0.4 -0.75,0 -0.6,0.4 ; -0.4,0.4 -0.1,0.4 ; -0.4,0.4 -0.4,-0.4 -0.1,-0.4 -0.1,0.4 ; -0.4,0.4 -0.25,0 -0.1,0.4 ; 0.1,0.4 0.4,0.4 ; 0.1,0.4 0.1,-0.4 0.4,-0.4 0.4,0.4 ; 0.1,0.4 0.25,0 0.4,0.4 ; 0.6,0.4 0.9,0.4 ; 0.6,0.4 0.6,-0.4 0.9,-0.4 0.9,0.4 ; 0.6,0.4 0.75,0 0.9,0.4 ; 1.1,0.4 1.4,0.4 ; 1.1,0.4 1.1,-0.4 1.4,-0.4 1.4,0.4 ; 1.1,0.4 1.25,0 1.4,0.4 ; 1.6,0.4 1.9,0.4 ; 1.6,0.4 1.6,-0.4 1.9,-0.4 1.9,0.4 ; 1.6,0.4 1.75,0 1.9,0.4 ; 2.1,0.4 2.4,0.4 ; 2.1,0.4 2.1,-0.4 2.4,-0.4 2.4,0.4 ; 2.1,0.4 2.25,0 2.4,0.4 ; 3.5,-3.45 4.7,-1.925 5.9,-0.4 ; 3.5,-3.45 4.8,-3.45 4.8,-2.6 ; 3.5,-3.45 3.5,-0.4 ; 3.5,-0.4 5.9,-0.4 ; 4.8,-2.6 5.35,-1.5 5.9,-2.6 ; 4.8,-2.6 5.9,-2.6 ; 5.9,-2.6 5.9,-0.4 ; -3.4,-2.34 -2.7,-2.34 -2.7,-1 -3.4,-1 -3.4,-2.34 ; 2.7,-2.34 3.4,-2.34 3.4,-1 2.7,-1 2.7,-2.34
Mechanical 14:
  circle w0.25: c-2.975,0.4 r0.125
  lines w0.1: -4.85,-6.3 -4.564,-5.8 -4.275,-6.3 ; -4.65,-1.8 -5.35,-1.8 -5.35,-1.6 -4.85,-1.6 -4.85,-1.3 -5.35,-1.3 -5.35,-1.1 -4.85,-1.1 -4.85,-0.9 -4.65,-0.9 ; -3.975,-5.5 -3.975,-4.1 ; -3.975,-4.7 -4.125,-4.613 -4.125,-4.387 -3.975,-4.3 ; -3.815,-5.5 -3.815,-4.1 ; -3.325,-5.5 -3.325,-4.426 -3.075,-4.426 ; -3.075,-5.5 -3.075,-4.426 ; -2.775,-4.216 cw(c-2.985,-4.216) -2.985,-4.426 -3.075,-4.426 ; -2.35,-0.593 -2.35,0.1 -2.15,0.1 -2.15,-0.593 ; -1.85,-0.593 -1.85,0.1 -1.65,0.1 -1.65,-0.593 ; -1.35,-0.593 -1.35,0.1 -1.15,0.1 -1.15,-0.593 ; -0.85,-0.593 -0.85,0.1 -0.65,0.1 -0.65,-0.593 ; -0.35,-0.593 -0.35,0.1 -0.15,0.1 -0.15,-0.593 ; 0.15,-0.593 0.15,0.1 0.35,0.1 0.35,-0.593 ; 0.65,-0.593 0.65,0.1 0.85,0.1 0.85,-0.593 ; 1.15,-0.593 1.15,0.1 1.35,0.1 1.35,-0.593 ; 1.65,-0.593 1.65,0.1 1.85,0.1 1.85,-0.593 ; 2.15,-0.593 2.15,0.1 2.35,0.1 2.35,-0.593 ; 2.775,-4.216 ccw(c2.985,-4.216) 2.985,-4.426 3.325,-4.426 3.325,-5.5 ; 3.075,-5.5 3.075,-4.426 ; 3.815,-5.5 3.815,-4.1 ; 3.975,-5.5 3.975,-4.1 ; 3.975,-4.7 4.125,-4.613 4.125,-4.387 3.975,-4.3 ; 4.65,-1.8 5.35,-1.8 5.35,-1.6 4.85,-1.6 4.85,-1.3 5.35,-1.3 5.35,-1.1 4.85,-1.1 4.85,-0.9 4.65,-0.9 ; -5.55,-6.1 ccw(c-5.35,-6.1) -5.35,-6.3 5.35,-6.3 ccw(c5.35,-6.1) 5.55,-6.1 5.55,-5.5 2.825,-5.5 2.825,-6.05 -2.825,-6.05 -2.825,-5.5 -5.55,-5.5 -5.55,-6.1 ; -4.65,-4.1 -4.65,-0.6 4.65,-0.6 4.65,-4.1 3.775,-4.1 3.775,-1.225 ccw(c3.65,-1.225) 3.525,-1.225 3.525,-4.1 2.775,-4.1 2.775,-4.8 2.675,-4.9 -2.675,-4.9 -2.775,-4.8 -2.775,-4.1 -3.525,-4.1 -3.525,-1.225 ccw(c-3.65,-1.225) -3.775,-1.225 -3.775,-4.1 -4.65,-4.1
Mechanical 15:
  lines w0.05: -6.15,-2.85 -6.15,-0.15 -2.65,-0.15 -2.65,0.65 2.65,0.65 2.65,-0.15 6.15,-0.15 6.15,-2.85 5.8,-2.85 5.8,-6.55 -5.8,-6.55 -5.8,-2.85 -6.15,-2.85
3D body "MOLEX_52745-1097.stp": height 2, standoff 0, extent -5.55,-6.3 5.55,0.1

## MOLEX_71430-0013 [mm]
height 12.56
pads (72):
  oval 0.9x1.4 hole 0.65 copper offset 0,-0.15: 1(-13.005,-1.75) 3(-11.405,-1.75) 5(-9.805,-1.75) 7(-8.205,-1.75) 9(-6.605,-1.75) 11(-5.005,-1.75) 13(-3.405,-1.75) 15(-1.805,-1.75) 17(-0.205,-1.75) 19(1.395,-1.75) 21(2.995,-1.75) 23(4.595,-1.75) 25(6.195,-1.75) 27(7.795,-1.75) 29(9.395,-1.75) 31(10.995,-1.75) 33(12.595,-1.75)
  oval 0.9x1.1 hole 0.65 rot 45: 2(-12.205,-0.6) 4(-10.605,-0.6) 6(-9.005,-0.6) 8(-7.405,-0.6) 10(-5.805,-0.6) 12(-4.205,-0.6) 14(-2.605,-0.6) 16(-1.005,-0.6) 18(0.595,-0.6) 20(2.195,-0.6) 22(3.795,-0.6) 24(5.395,-0.6) 26(6.995,-0.6) 28(8.595,-0.6) 30(10.195,-0.6) 32(11.795,-0.6) 34(13.395,-0.6)
  oval 0.9x1.1 hole 0.65: 35(-13.405,0.6) 36(-12.605,1.75) 37(-11.805,0.6) 38(-11.005,1.75) 39(-10.205,0.6) 40(-9.405,1.75) 41(-8.605,0.6) 42(-7.805,1.75) 43(-7.005,0.6) 44(-6.205,1.75) 45(-5.405,0.6) 46(-4.605,1.75) 47(-3.805,0.6) 48(-3.005,1.75) 49(-2.205,0.6) 50(-1.405,1.75) 51(-0.605,0.6) 52(0.195,1.75) 53(0.995,0.6) 54(1.795,1.75) 55(2.595,0.6) 56(3.395,1.75) 57(4.195,0.6) 58(4.995,1.75) 59(5.795,0.6) 60(6.595,1.75) 61(7.395,0.6) 62(8.195,1.75) 63(8.995,0.6) 64(9.795,1.75) 65(10.595,0.6) 66(11.395,1.75) 67(12.195,0.6) 68(12.995,1.75)
  round 2.25 hole 1.2: 69(-16.175,0.5) 70(16.175,0.5)
  round 2 hole 1.75 unplated mask+0.375: 71(-20.95,3.13) 72(20.95,3.13)
Top Overlay:
  circle w0.2: c18.75,0.4 r0.4
  circle w0.2: c-18.75,0.4 r0.4
  lines w0.2: -21.35,1.919 -21.35,-2.4 -14,-2.4 -14,-0.042 ; -21.35,4.341 -21.35,7.131 21.35,7.131 21.35,4.341 ; -21.35,4.6 -16.15,4.6 -16.15,2.025 ; -21.35,6.8 21.35,6.8 ; -20.55,-2.4 -20.55,1.919 ; -19.765,3.6 -17.05,3.6 -17.05,1.749 ; -17.05,-2.4 -17.05,-0.749 ; -16.15,-2.4 -16.15,-1.025 ; -15.796,7.131 -15.796,12.05 cw(c-15.596,12.05) -15.596,12.25 15.596,12.25 cw(c15.596,12.05) 15.796,12.05 15.796,7.131 ; -15,-2.4 -15,-0.472 ; -15,1.472 -15,4.6 15,4.6 15,1.472 ; -14.653,0.6 -14.28,0.6 ; -13,4.6 -13,6.798 ; -9,4.6 -8.995,6.8 ; -2,4.6 -2,6.798 ; 2,4.6 2,6.798 ; 9,4.6 9,6.798 ; 13,4.6 13,6.798 ; 14,-1.232 14,-2.4 21.35,-2.4 21.35,1.919 ; 14,0.032 14,0.6 14.653,0.6 ; 15,-2.4 15,-0.472 ; 16.15,-2.4 16.15,-1.025 ; 16.15,2.025 16.15,4.6 21.35,4.6 ; 17.05,-2.4 17.05,-0.749 ; 17.05,1.749 17.05,3.6 19.765,3.6 ; 20.55,-2.4 20.55,1.919 ; -12,4.85 -12,6.55 -10,6.55 -10,4.85 -12,4.85 ; -1,4.85 -1,6.55 1,6.55 1,4.85 -1,4.85 ; 10,4.85 10,6.55 12,6.55 12,4.85 10,4.85
  text "36" at -13.294,2.761 h1.2
  text "1" at -18.9,-1.775 h1.2
  text "68" at 12.306,2.761 h1.2
  text "33" at 17.9,-1.8 h1.2
Mechanical 8:
  drawing of 298 lines, arcs and shapes, not listed
  text "EDGE OF PCB" at -4.017,7.222 h1
Mechanical 14:
  drawing of 251 lines, arcs and shapes, not listed
  text "1" at -13.159,-4.073 h1.2
  text "33" at 11.62,-4.071 h1.2
3D body "MOLEX_71430-0013.stp": height 6.28, standoff -2.48, extent -21.35,-2.4 21.35,12.25